# Altium footprint library ST封装.PcbLib: 1336 footprints (part 102 of 109)
Each footprint in its own frame and in the unit in brackets; x right, y up, seen from the top. Pads: shape width x height; smd on the part's side, far side on the other; paste and mask are expansions set on the pad; w line width, h text height; cw(c..) or ccw(c..) is an arc to the next point about the centre after c.
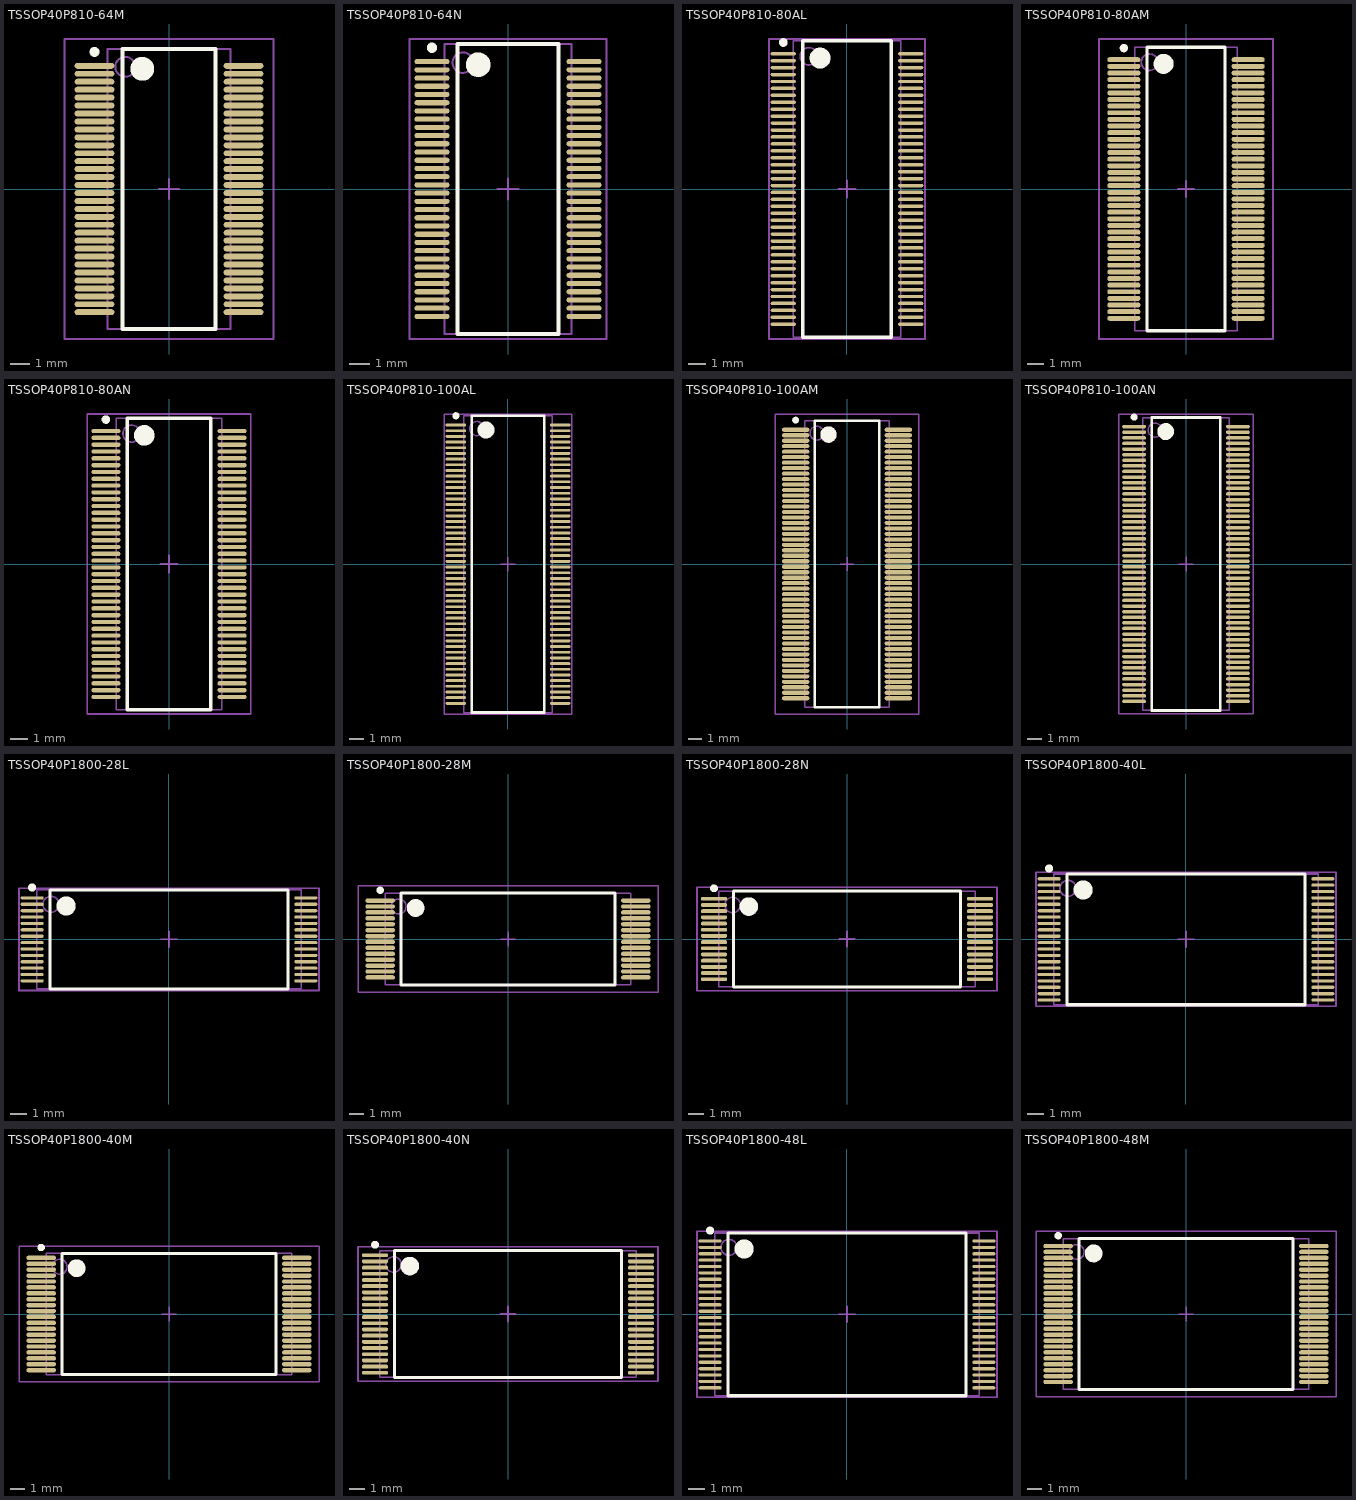
[diagram p101: the footprints below, top view; thin cyan lines are the x and y axes]

## TSSOP40P810-64M [mm] "TSSOP, 64-Leads, Body 14x6.1mm, Pitch 0.4mm, IPC Low Density"
height 1.2
pads (64):
  oval 2x0.3 smd: 1(-3.75,6.2) 2(-3.75,5.8) 3(-3.75,5.4) 4(-3.75,5) 5(-3.75,4.6) 6(-3.75,4.2) 7(-3.75,3.8) 8(-3.75,3.4) 9(-3.75,3) 10(-3.75,2.6) 11(-3.75,2.2) 12(-3.75,1.8) 13(-3.75,1.4) 14(-3.75,1) 15(-3.75,0.6) 16(-3.75,0.2) 17(-3.75,-0.2) 18(-3.75,-0.6) 19(-3.75,-1) 20(-3.75,-1.4) 21(-3.75,-1.8) 22(-3.75,-2.2) 23(-3.75,-2.6) 24(-3.75,-3) 25(-3.75,-3.4) 26(-3.75,-3.8) 27(-3.75,-4.2) 28(-3.75,-4.6) 29(-3.75,-5) 30(-3.75,-5.4) 31(-3.75,-5.8) 32(-3.75,-6.2) 33(3.75,-6.2) 34(3.75,-5.8) 35(3.75,-5.4) 36(3.75,-5) 37(3.75,-4.6) 38(3.75,-4.2) 39(3.75,-3.8) 40(3.75,-3.4) 41(3.75,-3) 42(3.75,-2.6) 43(3.75,-2.2) 44(3.75,-1.8) 45(3.75,-1.4) 46(3.75,-1) 47(3.75,-0.6) 48(3.75,-0.2) 49(3.75,0.2) 50(3.75,0.6) 51(3.75,1) 52(3.75,1.4) 53(3.75,1.8) 54(3.75,2.2) 55(3.75,2.6) 56(3.75,3) 57(3.75,3.4) 58(3.75,3.8) 59(3.75,4.2) 60(3.75,4.6) 61(3.75,5) 62(3.75,5.4) 63(3.75,5.8) 64(3.75,6.2)
Top Overlay:
  circle w0.6: c-1.35,6.05 r0.3
  circle w0.25: c-3.75,6.9 r0.125
  lines w0.2: -2.35,-7.05 2.35,-7.05 2.35,7.05 -2.35,7.05 -2.35,-7.05
Mechanical 13:
  circle w0.1: c-2.2,6.15 r0.5
  lines w0.1: -3.1,-7.05 3.1,-7.05 3.1,7.05 -3.1,7.05 -3.1,-7.05
Mechanical 15:
  lines w0.1: -0.5,0 0.5,0 ; 0,-0.5 0,0.5 ; -5.25,-7.55 5.25,-7.55 5.25,7.55 -5.25,7.55 -5.25,-7.55
3D body: height 1.2, standoff 0, extent -3.1,-7.05 3.1,7.05

## TSSOP40P810-64N [mm] "TSSOP, 64-Leads, Body 14x6.1mm, Pitch 0.4mm, IPC Medium Density"
height 1.2
pads (64):
  oval 1.7x0.25 smd: 1(-3.7,6.2) 2(-3.7,5.8) 3(-3.7,5.4) 4(-3.7,5) 5(-3.7,4.6) 6(-3.7,4.2) 7(-3.7,3.8) 8(-3.7,3.4) 9(-3.7,3) 10(-3.7,2.6) 11(-3.7,2.2) 12(-3.7,1.8) 13(-3.7,1.4) 14(-3.7,1) 15(-3.7,0.6) 16(-3.7,0.2) 17(-3.7,-0.2) 18(-3.7,-0.6) 19(-3.7,-1) 20(-3.7,-1.4) 21(-3.7,-1.8) 22(-3.7,-2.2) 23(-3.7,-2.6) 24(-3.7,-3) 25(-3.7,-3.4) 26(-3.7,-3.8) 27(-3.7,-4.2) 28(-3.7,-4.6) 29(-3.7,-5) 30(-3.7,-5.4) 31(-3.7,-5.8) 32(-3.7,-6.2) 33(3.7,-6.2) 34(3.7,-5.8) 35(3.7,-5.4) 36(3.7,-5) 37(3.7,-4.6) 38(3.7,-4.2) 39(3.7,-3.8) 40(3.7,-3.4) 41(3.7,-3) 42(3.7,-2.6) 43(3.7,-2.2) 44(3.7,-1.8) 45(3.7,-1.4) 46(3.7,-1) 47(3.7,-0.6) 48(3.7,-0.2) 49(3.7,0.2) 50(3.7,0.6) 51(3.7,1) 52(3.7,1.4) 53(3.7,1.8) 54(3.7,2.2) 55(3.7,2.6) 56(3.7,3) 57(3.7,3.4) 58(3.7,3.8) 59(3.7,4.2) 60(3.7,4.6) 61(3.7,5) 62(3.7,5.4) 63(3.7,5.8) 64(3.7,6.2)
Top Overlay:
  circle w0.6: c-1.45,6.05 r0.3
  circle w0.25: c-3.7,6.875 r0.125
  lines w0.2: -2.45,-7.05 2.45,-7.05 2.45,7.05 -2.45,7.05 -2.45,-7.05
Mechanical 13:
  circle w0.1: c-2.2,6.15 r0.5
  lines w0.1: -3.1,-7.05 3.1,-7.05 3.1,7.05 -3.1,7.05 -3.1,-7.05
Mechanical 15:
  lines w0.1: -0.5,0 0.5,0 ; 0,-0.5 0,0.5 ; -4.8,-7.3 4.8,-7.3 4.8,7.3 -4.8,7.3 -4.8,-7.3
3D body: height 1.2, standoff 0, extent -3.1,-7.05 3.1,7.05

## TSSOP40P810-80AL [mm] "TSSOP, 80-Leads, Body 17x6.1mm, Pitch 0.4mm, IPC High Density"
height 1.2
pads (80):
  oval 1.45x0.2 smd: 1(-3.675,7.8) 2(-3.675,7.4) 3(-3.675,7) 4(-3.675,6.6) 5(-3.675,6.2) 6(-3.675,5.8) 7(-3.675,5.4) 8(-3.675,5) 9(-3.675,4.6) 10(-3.675,4.2) 11(-3.675,3.8) 12(-3.675,3.4) 13(-3.675,3) 14(-3.675,2.6) 15(-3.675,2.2) 16(-3.675,1.8) 17(-3.675,1.4) 18(-3.675,1) 19(-3.675,0.6) 20(-3.675,0.2) 21(-3.675,-0.2) 22(-3.675,-0.6) 23(-3.675,-1) 24(-3.675,-1.4) 25(-3.675,-1.8) 26(-3.675,-2.2) 27(-3.675,-2.6) 28(-3.675,-3) 29(-3.675,-3.4) 30(-3.675,-3.8) 31(-3.675,-4.2) 32(-3.675,-4.6) 33(-3.675,-5) 34(-3.675,-5.4) 35(-3.675,-5.8) 36(-3.675,-6.2) 37(-3.675,-6.6) 38(-3.675,-7) 39(-3.675,-7.4) 40(-3.675,-7.8) 41(3.675,-7.8) 42(3.675,-7.4) 43(3.675,-7) 44(3.675,-6.6) 45(3.675,-6.2) 46(3.675,-5.8) 47(3.675,-5.4) 48(3.675,-5) 49(3.675,-4.6) 50(3.675,-4.2) 51(3.675,-3.8) 52(3.675,-3.4) 53(3.675,-3) 54(3.675,-2.6) 55(3.675,-2.2) 56(3.675,-1.8) 57(3.675,-1.4) 58(3.675,-1) 59(3.675,-0.6) 60(3.675,-0.2) 61(3.675,0.2) 62(3.675,0.6) 63(3.675,1) 64(3.675,1.4) 65(3.675,1.8) 66(3.675,2.2) 67(3.675,2.6) 68(3.675,3) 69(3.675,3.4) 70(3.675,3.8) 71(3.675,4.2) 72(3.675,4.6) 73(3.675,5) 74(3.675,5.4) 75(3.675,5.8) 76(3.675,6.2) 77(3.675,6.6) 78(3.675,7) 79(3.675,7.4) 80(3.675,7.8)
Top Overlay:
  circle w0.6: c-1.55,7.55 r0.3
  circle w0.25: c-3.675,8.45 r0.125
  lines w0.2: -2.55,-8.55 2.55,-8.55 2.55,8.55 -2.55,8.55 -2.55,-8.55
Mechanical 13:
  circle w0.1: c-2.2,7.65 r0.5
  lines w0.1: -3.1,-8.55 3.1,-8.55 3.1,8.55 -3.1,8.55 -3.1,-8.55
Mechanical 15:
  lines w0.1: -0.5,0 0.5,0 ; 0,-0.5 0,0.5 ; -4.5,-8.65 4.5,-8.65 4.5,8.65 -4.5,8.65 -4.5,-8.65
3D body: height 1.2, standoff 0, extent -3.1,-8.55 3.1,8.55

## TSSOP40P810-80AM [mm] "TSSOP, 80-Leads, Body 17x6.1mm, Pitch 0.4mm, IPC Low Density"
height 1.2
pads (80):
  oval 2x0.3 smd: 1(-3.75,7.8) 2(-3.75,7.4) 3(-3.75,7) 4(-3.75,6.6) 5(-3.75,6.2) 6(-3.75,5.8) 7(-3.75,5.4) 8(-3.75,5) 9(-3.75,4.6) 10(-3.75,4.2) 11(-3.75,3.8) 12(-3.75,3.4) 13(-3.75,3) 14(-3.75,2.6) 15(-3.75,2.2) 16(-3.75,1.8) 17(-3.75,1.4) 18(-3.75,1) 19(-3.75,0.6) 20(-3.75,0.2) 21(-3.75,-0.2) 22(-3.75,-0.6) 23(-3.75,-1) 24(-3.75,-1.4) 25(-3.75,-1.8) 26(-3.75,-2.2) 27(-3.75,-2.6) 28(-3.75,-3) 29(-3.75,-3.4) 30(-3.75,-3.8) 31(-3.75,-4.2) 32(-3.75,-4.6) 33(-3.75,-5) 34(-3.75,-5.4) 35(-3.75,-5.8) 36(-3.75,-6.2) 37(-3.75,-6.6) 38(-3.75,-7) 39(-3.75,-7.4) 40(-3.75,-7.8) 41(3.75,-7.8) 42(3.75,-7.4) 43(3.75,-7) 44(3.75,-6.6) 45(3.75,-6.2) 46(3.75,-5.8) 47(3.75,-5.4) 48(3.75,-5) 49(3.75,-4.6) 50(3.75,-4.2) 51(3.75,-3.8) 52(3.75,-3.4) 53(3.75,-3) 54(3.75,-2.6) 55(3.75,-2.2) 56(3.75,-1.8) 57(3.75,-1.4) 58(3.75,-1) 59(3.75,-0.6) 60(3.75,-0.2) 61(3.75,0.2) 62(3.75,0.6) 63(3.75,1) 64(3.75,1.4) 65(3.75,1.8) 66(3.75,2.2) 67(3.75,2.6) 68(3.75,3) 69(3.75,3.4) 70(3.75,3.8) 71(3.75,4.2) 72(3.75,4.6) 73(3.75,5) 74(3.75,5.4) 75(3.75,5.8) 76(3.75,6.2) 77(3.75,6.6) 78(3.75,7) 79(3.75,7.4) 80(3.75,7.8)
Top Overlay:
  circle w0.6: c-1.35,7.55 r0.3
  circle w0.25: c-3.75,8.5 r0.125
  lines w0.2: -2.35,-8.55 2.35,-8.55 2.35,8.55 -2.35,8.55 -2.35,-8.55
Mechanical 13:
  circle w0.1: c-2.2,7.65 r0.5
  lines w0.1: -3.1,-8.55 3.1,-8.55 3.1,8.55 -3.1,8.55 -3.1,-8.55
Mechanical 15:
  lines w0.1: -0.5,0 0.5,0 ; 0,-0.5 0,0.5 ; -5.25,-9.05 5.25,-9.05 5.25,9.05 -5.25,9.05 -5.25,-9.05
3D body: height 1.2, standoff 0, extent -3.1,-8.55 3.1,8.55

## TSSOP40P810-80AN [mm] "TSSOP, 80-Leads, Body 17x6.1mm, Pitch 0.4mm, IPC Medium Density"
height 1.2
pads (80):
  oval 1.7x0.25 smd: 1(-3.7,7.8) 2(-3.7,7.4) 3(-3.7,7) 4(-3.7,6.6) 5(-3.7,6.2) 6(-3.7,5.8) 7(-3.7,5.4) 8(-3.7,5) 9(-3.7,4.6) 10(-3.7,4.2) 11(-3.7,3.8) 12(-3.7,3.4) 13(-3.7,3) 14(-3.7,2.6) 15(-3.7,2.2) 16(-3.7,1.8) 17(-3.7,1.4) 18(-3.7,1) 19(-3.7,0.6) 20(-3.7,0.2) 21(-3.7,-0.2) 22(-3.7,-0.6) 23(-3.7,-1) 24(-3.7,-1.4) 25(-3.7,-1.8) 26(-3.7,-2.2) 27(-3.7,-2.6) 28(-3.7,-3) 29(-3.7,-3.4) 30(-3.7,-3.8) 31(-3.7,-4.2) 32(-3.7,-4.6) 33(-3.7,-5) 34(-3.7,-5.4) 35(-3.7,-5.8) 36(-3.7,-6.2) 37(-3.7,-6.6) 38(-3.7,-7) 39(-3.7,-7.4) 40(-3.7,-7.8) 41(3.7,-7.8) 42(3.7,-7.4) 43(3.7,-7) 44(3.7,-6.6) 45(3.7,-6.2) 46(3.7,-5.8) 47(3.7,-5.4) 48(3.7,-5) 49(3.7,-4.6) 50(3.7,-4.2) 51(3.7,-3.8) 52(3.7,-3.4) 53(3.7,-3) 54(3.7,-2.6) 55(3.7,-2.2) 56(3.7,-1.8) 57(3.7,-1.4) 58(3.7,-1) 59(3.7,-0.6) 60(3.7,-0.2) 61(3.7,0.2) 62(3.7,0.6) 63(3.7,1) 64(3.7,1.4) 65(3.7,1.8) 66(3.7,2.2) 67(3.7,2.6) 68(3.7,3) 69(3.7,3.4) 70(3.7,3.8) 71(3.7,4.2) 72(3.7,4.6) 73(3.7,5) 74(3.7,5.4) 75(3.7,5.8) 76(3.7,6.2) 77(3.7,6.6) 78(3.7,7) 79(3.7,7.4) 80(3.7,7.8)
Top Overlay:
  circle w0.6: c-1.45,7.55 r0.3
  circle w0.25: c-3.7,8.475 r0.125
  lines w0.2: -2.45,-8.55 2.45,-8.55 2.45,8.55 -2.45,8.55 -2.45,-8.55
Mechanical 13:
  circle w0.1: c-2.2,7.65 r0.5
  lines w0.1: -3.1,-8.55 3.1,-8.55 3.1,8.55 -3.1,8.55 -3.1,-8.55
Mechanical 15:
  lines w0.1: -0.5,0 0.5,0 ; 0,-0.5 0,0.5 ; -4.8,-8.8 4.8,-8.8 4.8,8.8 -4.8,8.8 -4.8,-8.8
3D body: height 1.2, standoff 0, extent -3.1,-8.55 3.1,8.55

## TSSOP40P810-100AL [mm] "TSSOP, 100-Leads, Body 20.8x6.1mm, Pitch 0.4mm, IPC High Density"
height 1.2
pads (100):
  oval 1.45x0.2 smd: 1(-3.675,9.8) 2(-3.675,9.4) 3(-3.675,9) 4(-3.675,8.6) 5(-3.675,8.2) 6(-3.675,7.8) 7(-3.675,7.4) 8(-3.675,7) 9(-3.675,6.6) 10(-3.675,6.2) 11(-3.675,5.8) 12(-3.675,5.4) 13(-3.675,5) 14(-3.675,4.6) 15(-3.675,4.2) 16(-3.675,3.8) 17(-3.675,3.4) 18(-3.675,3) 19(-3.675,2.6) 20(-3.675,2.2) 21(-3.675,1.8) 22(-3.675,1.4) 23(-3.675,1) 24(-3.675,0.6) 25(-3.675,0.2) 26(-3.675,-0.2) 27(-3.675,-0.6) 28(-3.675,-1) 29(-3.675,-1.4) 30(-3.675,-1.8) 31(-3.675,-2.2) 32(-3.675,-2.6) 33(-3.675,-3) 34(-3.675,-3.4) 35(-3.675,-3.8) 36(-3.675,-4.2) 37(-3.675,-4.6) 38(-3.675,-5) 39(-3.675,-5.4) 40(-3.675,-5.8) 41(-3.675,-6.2) 42(-3.675,-6.6) 43(-3.675,-7) 44(-3.675,-7.4) 45(-3.675,-7.8) 46(-3.675,-8.2) 47(-3.675,-8.6) 48(-3.675,-9) 49(-3.675,-9.4) 50(-3.675,-9.8) 51(3.675,-9.8) 52(3.675,-9.4) 53(3.675,-9) 54(3.675,-8.6) 55(3.675,-8.2) 56(3.675,-7.8) 57(3.675,-7.4) 58(3.675,-7) 59(3.675,-6.6) 60(3.675,-6.2) 61(3.675,-5.8) 62(3.675,-5.4) 63(3.675,-5) 64(3.675,-4.6) 65(3.675,-4.2) 66(3.675,-3.8) 67(3.675,-3.4) 68(3.675,-3) 69(3.675,-2.6) 70(3.675,-2.2) 71(3.675,-1.8) 72(3.675,-1.4) 73(3.675,-1) 74(3.675,-0.6) 75(3.675,-0.2) 76(3.675,0.2) 77(3.675,0.6) 78(3.675,1) 79(3.675,1.4) 80(3.675,1.8) 81(3.675,2.2) 82(3.675,2.6) 83(3.675,3) 84(3.675,3.4) 85(3.675,3.8) 86(3.675,4.2) 87(3.675,4.6) 88(3.675,5) 89(3.675,5.4) 90(3.675,5.8) 91(3.675,6.2) 92(3.675,6.6) 93(3.675,7) 94(3.675,7.4) 95(3.675,7.8) 96(3.675,8.2) 97(3.675,8.6) 98(3.675,9) 99(3.675,9.4) 100(3.675,9.8)
Top Overlay:
  circle w0.6: c-1.55,9.45 r0.3
  circle w0.25: c-3.675,10.45 r0.125
  lines w0.2: -2.55,-10.45 2.55,-10.45 2.55,10.45 -2.55,10.45 -2.55,-10.45
Mechanical 13:
  circle w0.1: c-2.2,9.55 r0.5
  lines w0.1: -3.1,-10.45 3.1,-10.45 3.1,10.45 -3.1,10.45 -3.1,-10.45
Mechanical 15:
  lines w0.1: -0.5,0 0.5,0 ; 0,-0.5 0,0.5 ; -4.5,-10.55 4.5,-10.55 4.5,10.55 -4.5,10.55 -4.5,-10.55
3D body: height 1.2, standoff 0, extent -3.1,-10.45 3.1,10.45

## TSSOP40P810-100AM [mm] "TSSOP, 100-Leads, Body 20.8x6.1mm, Pitch 0.4mm, IPC Low Density"
height 1.2
pads (100):
  oval 2x0.3 smd: 1(-3.75,9.8) 2(-3.75,9.4) 3(-3.75,9) 4(-3.75,8.6) 5(-3.75,8.2) 6(-3.75,7.8) 7(-3.75,7.4) 8(-3.75,7) 9(-3.75,6.6) 10(-3.75,6.2) 11(-3.75,5.8) 12(-3.75,5.4) 13(-3.75,5) 14(-3.75,4.6) 15(-3.75,4.2) 16(-3.75,3.8) 17(-3.75,3.4) 18(-3.75,3) 19(-3.75,2.6) 20(-3.75,2.2) 21(-3.75,1.8) 22(-3.75,1.4) 23(-3.75,1) 24(-3.75,0.6) 25(-3.75,0.2) 26(-3.75,-0.2) 27(-3.75,-0.6) 28(-3.75,-1) 29(-3.75,-1.4) 30(-3.75,-1.8) 31(-3.75,-2.2) 32(-3.75,-2.6) 33(-3.75,-3) 34(-3.75,-3.4) 35(-3.75,-3.8) 36(-3.75,-4.2) 37(-3.75,-4.6) 38(-3.75,-5) 39(-3.75,-5.4) 40(-3.75,-5.8) 41(-3.75,-6.2) 42(-3.75,-6.6) 43(-3.75,-7) 44(-3.75,-7.4) 45(-3.75,-7.8) 46(-3.75,-8.2) 47(-3.75,-8.6) 48(-3.75,-9) 49(-3.75,-9.4) 50(-3.75,-9.8) 51(3.75,-9.8) 52(3.75,-9.4) 53(3.75,-9) 54(3.75,-8.6) 55(3.75,-8.2) 56(3.75,-7.8) 57(3.75,-7.4) 58(3.75,-7) 59(3.75,-6.6) 60(3.75,-6.2) 61(3.75,-5.8) 62(3.75,-5.4) 63(3.75,-5) 64(3.75,-4.6) 65(3.75,-4.2) 66(3.75,-3.8) 67(3.75,-3.4) 68(3.75,-3) 69(3.75,-2.6) 70(3.75,-2.2) 71(3.75,-1.8) 72(3.75,-1.4) 73(3.75,-1) 74(3.75,-0.6) 75(3.75,-0.2) 76(3.75,0.2) 77(3.75,0.6) 78(3.75,1) 79(3.75,1.4) 80(3.75,1.8) 81(3.75,2.2) 82(3.75,2.6) 83(3.75,3) 84(3.75,3.4) 85(3.75,3.8) 86(3.75,4.2) 87(3.75,4.6) 88(3.75,5) 89(3.75,5.4) 90(3.75,5.8) 91(3.75,6.2) 92(3.75,6.6) 93(3.75,7) 94(3.75,7.4) 95(3.75,7.8) 96(3.75,8.2) 97(3.75,8.6) 98(3.75,9) 99(3.75,9.4) 100(3.75,9.8)
Top Overlay:
  circle w0.6: c-1.35,9.45 r0.3
  circle w0.25: c-3.75,10.5 r0.125
  lines w0.2: -2.35,-10.45 2.35,-10.45 2.35,10.45 -2.35,10.45 -2.35,-10.45
Mechanical 13:
  circle w0.1: c-2.2,9.55 r0.5
  lines w0.1: -3.1,-10.45 3.1,-10.45 3.1,10.45 -3.1,10.45 -3.1,-10.45
Mechanical 15:
  lines w0.1: -0.5,0 0.5,0 ; 0,-0.5 0,0.5 ; -5.25,-10.95 5.25,-10.95 5.25,10.95 -5.25,10.95 -5.25,-10.95
3D body: height 1.2, standoff 0, extent -3.1,-10.45 3.1,10.45

## TSSOP40P810-100AN [mm] "TSSOP, 100-Leads, Body 20.8x6.1mm, Pitch 0.4mm, IPC Medium Density"
height 1.2
pads (100):
  oval 1.7x0.25 smd: 1(-3.7,9.8) 2(-3.7,9.4) 3(-3.7,9) 4(-3.7,8.6) 5(-3.7,8.2) 6(-3.7,7.8) 7(-3.7,7.4) 8(-3.7,7) 9(-3.7,6.6) 10(-3.7,6.2) 11(-3.7,5.8) 12(-3.7,5.4) 13(-3.7,5) 14(-3.7,4.6) 15(-3.7,4.2) 16(-3.7,3.8) 17(-3.7,3.4) 18(-3.7,3) 19(-3.7,2.6) 20(-3.7,2.2) 21(-3.7,1.8) 22(-3.7,1.4) 23(-3.7,1) 24(-3.7,0.6) 25(-3.7,0.2) 26(-3.7,-0.2) 27(-3.7,-0.6) 28(-3.7,-1) 29(-3.7,-1.4) 30(-3.7,-1.8) 31(-3.7,-2.2) 32(-3.7,-2.6) 33(-3.7,-3) 34(-3.7,-3.4) 35(-3.7,-3.8) 36(-3.7,-4.2) 37(-3.7,-4.6) 38(-3.7,-5) 39(-3.7,-5.4) 40(-3.7,-5.8) 41(-3.7,-6.2) 42(-3.7,-6.6) 43(-3.7,-7) 44(-3.7,-7.4) 45(-3.7,-7.8) 46(-3.7,-8.2) 47(-3.7,-8.6) 48(-3.7,-9) 49(-3.7,-9.4) 50(-3.7,-9.8) 51(3.7,-9.8) 52(3.7,-9.4) 53(3.7,-9) 54(3.7,-8.6) 55(3.7,-8.2) 56(3.7,-7.8) 57(3.7,-7.4) 58(3.7,-7) 59(3.7,-6.6) 60(3.7,-6.2) 61(3.7,-5.8) 62(3.7,-5.4) 63(3.7,-5) 64(3.7,-4.6) 65(3.7,-4.2) 66(3.7,-3.8) 67(3.7,-3.4) 68(3.7,-3) 69(3.7,-2.6) 70(3.7,-2.2) 71(3.7,-1.8) 72(3.7,-1.4) 73(3.7,-1) 74(3.7,-0.6) 75(3.7,-0.2) 76(3.7,0.2) 77(3.7,0.6) 78(3.7,1) 79(3.7,1.4) 80(3.7,1.8) 81(3.7,2.2) 82(3.7,2.6) 83(3.7,3) 84(3.7,3.4) 85(3.7,3.8) 86(3.7,4.2) 87(3.7,4.6) 88(3.7,5) 89(3.7,5.4) 90(3.7,5.8) 91(3.7,6.2) 92(3.7,6.6) 93(3.7,7) 94(3.7,7.4) 95(3.7,7.8) 96(3.7,8.2) 97(3.7,8.6) 98(3.7,9) 99(3.7,9.4) 100(3.7,9.8)
Top Overlay:
  circle w0.6: c-1.45,9.45 r0.3
  circle w0.25: c-3.7,10.475 r0.125
  lines w0.2: -2.45,-10.45 2.45,-10.45 2.45,10.45 -2.45,10.45 -2.45,-10.45
Mechanical 13:
  circle w0.1: c-2.2,9.55 r0.5
  lines w0.1: -3.1,-10.45 3.1,-10.45 3.1,10.45 -3.1,10.45 -3.1,-10.45
Mechanical 15:
  lines w0.1: -0.5,0 0.5,0 ; 0,-0.5 0,0.5 ; -4.8,-10.7 4.8,-10.7 4.8,10.7 -4.8,10.7 -4.8,-10.7
3D body: height 1.2, standoff 0, extent -3.1,-10.45 3.1,10.45

## TSSOP40P1800-28L [mm] "TSSOP, 28-Leads, Body 6x16.4mm, Pitch 0.4mm, IPC High Density"
height 1.27
pads (28):
  oval 1.45x0.2 smd: 1(-8.575,2.6) 2(-8.575,2.2) 3(-8.575,1.8) 4(-8.575,1.4) 5(-8.575,1) 6(-8.575,0.6) 7(-8.575,0.2) 8(-8.575,-0.2) 9(-8.575,-0.6) 10(-8.575,-1) 11(-8.575,-1.4) 12(-8.575,-1.8) 13(-8.575,-2.2) 14(-8.575,-2.6) 15(8.575,-2.6) 16(8.575,-2.2) 17(8.575,-1.8) 18(8.575,-1.4) 19(8.575,-1) 20(8.575,-0.6) 21(8.575,-0.2) 22(8.575,0.2) 23(8.575,0.6) 24(8.575,1) 25(8.575,1.4) 26(8.575,1.8) 27(8.575,2.2) 28(8.575,2.6)
Top Overlay:
  circle w0.6: c-6.45,2.1 r0.3
  circle w0.25: c-8.575,3.25 r0.125
  lines w0.2: -7.45,-3.1 7.45,-3.1 7.45,3.1 -7.45,3.1 -7.45,-3.1
Mechanical 13:
  circle w0.1: c-7.4,2.2 r0.5
  lines w0.1: -8.3,-3.1 8.3,-3.1 8.3,3.1 -8.3,3.1 -8.3,-3.1
Mechanical 15:
  lines w0.1: -0.5,0 0.5,0 ; 0,-0.5 0,0.5 ; -9.4,-3.2 9.4,-3.2 9.4,3.2 -9.4,3.2 -9.4,-3.2
3D body: height 1.27, standoff 0, extent -8.3,-3.1 8.3,3.1

## TSSOP40P1800-28M [mm] "TSSOP, 28-Leads, Body 6x16.4mm, Pitch 0.4mm, IPC Low Density"
height 1.27
pads (28):
  oval 2x0.3 smd: 1(-8.65,2.6) 2(-8.65,2.2) 3(-8.65,1.8) 4(-8.65,1.4) 5(-8.65,1) 6(-8.65,0.6) 7(-8.65,0.2) 8(-8.65,-0.2) 9(-8.65,-0.6) 10(-8.65,-1) 11(-8.65,-1.4) 12(-8.65,-1.8) 13(-8.65,-2.2) 14(-8.65,-2.6) 15(8.65,-2.6) 16(8.65,-2.2) 17(8.65,-1.8) 18(8.65,-1.4) 19(8.65,-1) 20(8.65,-0.6) 21(8.65,-0.2) 22(8.65,0.2) 23(8.65,0.6) 24(8.65,1) 25(8.65,1.4) 26(8.65,1.8) 27(8.65,2.2) 28(8.65,2.6)
Top Overlay:
  circle w0.6: c-6.25,2.1 r0.3
  circle w0.25: c-8.65,3.3 r0.125
  lines w0.2: -7.25,-3.1 7.25,-3.1 7.25,3.1 -7.25,3.1 -7.25,-3.1
Mechanical 13:
  circle w0.1: c-7.4,2.2 r0.5
  lines w0.1: -8.3,-3.1 8.3,-3.1 8.3,3.1 -8.3,3.1 -8.3,-3.1
Mechanical 15:
  lines w0.1: -0.5,0 0.5,0 ; 0,-0.5 0,0.5 ; -10.15,-3.6 10.15,-3.6 10.15,3.6 -10.15,3.6 -10.15,-3.6
3D body: height 1.27, standoff 0, extent -8.3,-3.1 8.3,3.1

## TSSOP40P1800-28N [mm] "TSSOP, 28-Leads, Body 6x16.4mm, Pitch 0.4mm, IPC Medium Density"
height 1.27
pads (28):
  oval 1.7x0.25 smd: 1(-8.6,2.6) 2(-8.6,2.2) 3(-8.6,1.8) 4(-8.6,1.4) 5(-8.6,1) 6(-8.6,0.6) 7(-8.6,0.2) 8(-8.6,-0.2) 9(-8.6,-0.6) 10(-8.6,-1) 11(-8.6,-1.4) 12(-8.6,-1.8) 13(-8.6,-2.2) 14(-8.6,-2.6) 15(8.6,-2.6) 16(8.6,-2.2) 17(8.6,-1.8) 18(8.6,-1.4) 19(8.6,-1) 20(8.6,-0.6) 21(8.6,-0.2) 22(8.6,0.2) 23(8.6,0.6) 24(8.6,1) 25(8.6,1.4) 26(8.6,1.8) 27(8.6,2.2) 28(8.6,2.6)
Top Overlay:
  circle w0.6: c-6.35,2.1 r0.3
  circle w0.25: c-8.6,3.275 r0.125
  lines w0.2: -7.35,-3.1 7.35,-3.1 7.35,3.1 -7.35,3.1 -7.35,-3.1
Mechanical 13:
  circle w0.1: c-7.4,2.2 r0.5
  lines w0.1: -8.3,-3.1 8.3,-3.1 8.3,3.1 -8.3,3.1 -8.3,-3.1
Mechanical 15:
  lines w0.1: -0.5,0 0.5,0 ; 0,-0.5 0,0.5 ; -9.7,-3.35 9.7,-3.35 9.7,3.35 -9.7,3.35 -9.7,-3.35
3D body: height 1.27, standoff 0, extent -8.3,-3.1 8.3,3.1

## TSSOP40P1800-40L [mm] "TSSOP, 40-Leads, Body 8x16.4mm, Pitch 0.4mm, IPC High Density"
height 1.27
pads (40):
  oval 1.45x0.2 smd: 1(-8.575,3.8) 2(-8.575,3.4) 3(-8.575,3) 4(-8.575,2.6) 5(-8.575,2.2) 6(-8.575,1.8) 7(-8.575,1.4) 8(-8.575,1) 9(-8.575,0.6) 10(-8.575,0.2) 11(-8.575,-0.2) 12(-8.575,-0.6) 13(-8.575,-1) 14(-8.575,-1.4) 15(-8.575,-1.8) 16(-8.575,-2.2) 17(-8.575,-2.6) 18(-8.575,-3) 19(-8.575,-3.4) 20(-8.575,-3.8) 21(8.575,-3.8) 22(8.575,-3.4) 23(8.575,-3) 24(8.575,-2.6) 25(8.575,-2.2) 26(8.575,-1.8) 27(8.575,-1.4) 28(8.575,-1) 29(8.575,-0.6) 30(8.575,-0.2) 31(8.575,0.2) 32(8.575,0.6) 33(8.575,1) 34(8.575,1.4) 35(8.575,1.8) 36(8.575,2.2) 37(8.575,2.6) 38(8.575,3) 39(8.575,3.4) 40(8.575,3.8)
Top Overlay:
  circle w0.6: c-6.45,3.1 r0.3
  circle w0.25: c-8.575,4.45 r0.125
  lines w0.2: -7.45,-4.1 7.45,-4.1 7.45,4.1 -7.45,4.1 -7.45,-4.1
Mechanical 13:
  circle w0.1: c-7.4,3.2 r0.5
  lines w0.1: -8.3,-4.1 8.3,-4.1 8.3,4.1 -8.3,4.1 -8.3,-4.1
Mechanical 15:
  lines w0.1: -0.5,0 0.5,0 ; 0,-0.5 0,0.5 ; -9.4,-4.2 9.4,-4.2 9.4,4.2 -9.4,4.2 -9.4,-4.2
3D body: height 1.27, standoff 0, extent -8.3,-4.1 8.3,4.1

## TSSOP40P1800-40M [mm] "TSSOP, 40-Leads, Body 8x16.4mm, Pitch 0.4mm, IPC Low Density"
height 1.27
pads (40):
  oval 2x0.3 smd: 1(-8.65,3.8) 2(-8.65,3.4) 3(-8.65,3) 4(-8.65,2.6) 5(-8.65,2.2) 6(-8.65,1.8) 7(-8.65,1.4) 8(-8.65,1) 9(-8.65,0.6) 10(-8.65,0.2) 11(-8.65,-0.2) 12(-8.65,-0.6) 13(-8.65,-1) 14(-8.65,-1.4) 15(-8.65,-1.8) 16(-8.65,-2.2) 17(-8.65,-2.6) 18(-8.65,-3) 19(-8.65,-3.4) 20(-8.65,-3.8) 21(8.65,-3.8) 22(8.65,-3.4) 23(8.65,-3) 24(8.65,-2.6) 25(8.65,-2.2) 26(8.65,-1.8) 27(8.65,-1.4) 28(8.65,-1) 29(8.65,-0.6) 30(8.65,-0.2) 31(8.65,0.2) 32(8.65,0.6) 33(8.65,1) 34(8.65,1.4) 35(8.65,1.8) 36(8.65,2.2) 37(8.65,2.6) 38(8.65,3) 39(8.65,3.4) 40(8.65,3.8)
Top Overlay:
  circle w0.25: c-8.65,4.5 r0.125
  circle w0.6: c-6.25,3.1 r0.3
  lines w0.2: -7.25,-4.1 -7.25,4.1 7.25,4.1 7.25,-4.1 -7.25,-4.1
Mechanical 13:
  circle w0.1: c-7.4,3.2 r0.5
  lines w0.1: -8.3,-4.1 -8.3,4.1 8.3,4.1 8.3,-4.1 -8.3,-4.1
Mechanical 15:
  lines w0.1: -0.5,0 0.5,0 ; 0,-0.5 0,0.5 ; -10.15,-4.6 -10.15,4.6 10.15,4.6 10.15,-4.6 -10.15,-4.6
3D body: height 1.27, standoff 0, extent -8.3,-4.1 8.3,4.1

## TSSOP40P1800-40N [mm] "TSSOP, 40-Leads, Body 8x16.4mm, Pitch 0.4mm, IPC Medium Density"
height 1.27
pads (40):
  oval 1.7x0.25 smd: 1(-8.6,3.8) 2(-8.6,3.4) 3(-8.6,3) 4(-8.6,2.6) 5(-8.6,2.2) 6(-8.6,1.8) 7(-8.6,1.4) 8(-8.6,1) 9(-8.6,0.6) 10(-8.6,0.2) 11(-8.6,-0.2) 12(-8.6,-0.6) 13(-8.6,-1) 14(-8.6,-1.4) 15(-8.6,-1.8) 16(-8.6,-2.2) 17(-8.6,-2.6) 18(-8.6,-3) 19(-8.6,-3.4) 20(-8.6,-3.8) 21(8.6,-3.8) 22(8.6,-3.4) 23(8.6,-3) 24(8.6,-2.6) 25(8.6,-2.2) 26(8.6,-1.8) 27(8.6,-1.4) 28(8.6,-1) 29(8.6,-0.6) 30(8.6,-0.2) 31(8.6,0.2) 32(8.6,0.6) 33(8.6,1) 34(8.6,1.4) 35(8.6,1.8) 36(8.6,2.2) 37(8.6,2.6) 38(8.6,3) 39(8.6,3.4) 40(8.6,3.8)
Top Overlay:
  circle w0.6: c-6.35,3.1 r0.3
  circle w0.25: c-8.6,4.475 r0.125
  lines w0.2: -7.35,-4.1 7.35,-4.1 7.35,4.1 -7.35,4.1 -7.35,-4.1
Mechanical 13:
  circle w0.1: c-7.4,3.2 r0.5
  lines w0.1: -8.3,-4.1 8.3,-4.1 8.3,4.1 -8.3,4.1 -8.3,-4.1
Mechanical 15:
  lines w0.1: -0.5,0 0.5,0 ; 0,-0.5 0,0.5 ; -9.7,-4.35 9.7,-4.35 9.7,4.35 -9.7,4.35 -9.7,-4.35
3D body: height 1.27, standoff 0, extent -8.3,-4.1 8.3,4.1

## TSSOP40P1800-48L [mm] "TSSOP, 48-Leads, Body 10x16.4mm, Pitch 0.4mm, IPC High Density"
height 1.27
pads (48):
  oval 1.45x0.2 smd: 1(-8.575,4.6) 2(-8.575,4.2) 3(-8.575,3.8) 4(-8.575,3.4) 5(-8.575,3) 6(-8.575,2.6) 7(-8.575,2.2) 8(-8.575,1.8) 9(-8.575,1.4) 10(-8.575,1) 11(-8.575,0.6) 12(-8.575,0.2) 13(-8.575,-0.2) 14(-8.575,-0.6) 15(-8.575,-1) 16(-8.575,-1.4) 17(-8.575,-1.8) 18(-8.575,-2.2) 19(-8.575,-2.6) 20(-8.575,-3) 21(-8.575,-3.4) 22(-8.575,-3.8) 23(-8.575,-4.2) 24(-8.575,-4.6) 25(8.575,-4.6) 26(8.575,-4.2) 27(8.575,-3.8) 28(8.575,-3.4) 29(8.575,-3) 30(8.575,-2.6) 31(8.575,-2.2) 32(8.575,-1.8) 33(8.575,-1.4) 34(8.575,-1) 35(8.575,-0.6) 36(8.575,-0.2) 37(8.575,0.2) 38(8.575,0.6) 39(8.575,1) 40(8.575,1.4) 41(8.575,1.8) 42(8.575,2.2) 43(8.575,2.6) 44(8.575,3) 45(8.575,3.4) 46(8.575,3.8) 47(8.575,4.2) 48(8.575,4.6)
Top Overlay:
  circle w0.6: c-6.45,4.1 r0.3
  circle w0.25: c-8.575,5.25 r0.125
  lines w0.2: -7.45,-5.1 7.45,-5.1 7.45,5.1 -7.45,5.1 -7.45,-5.1
Mechanical 13:
  circle w0.1: c-7.4,4.2 r0.5
  lines w0.1: -8.3,-5.1 8.3,-5.1 8.3,5.1 -8.3,5.1 -8.3,-5.1
Mechanical 15:
  lines w0.1: -0.5,0 0.5,0 ; 0,-0.5 0,0.5 ; -9.4,-5.2 9.4,-5.2 9.4,5.2 -9.4,5.2 -9.4,-5.2
3D body: height 1.27, standoff 0, extent -8.3,-5.1 8.3,5.1

## TSSOP40P1800-48M [mm] "TSSOP, 48-Leads, Body 10x16.4mm, Pitch 0.4mm, IPC Low Density"
height 1.27
pads (48):
  oval 2x0.3 smd: 1(-8.65,4.6) 2(-8.65,4.2) 3(-8.65,3.8) 4(-8.65,3.4) 5(-8.65,3) 6(-8.65,2.6) 7(-8.65,2.2) 8(-8.65,1.8) 9(-8.65,1.4) 10(-8.65,1) 11(-8.65,0.6) 12(-8.65,0.2) 13(-8.65,-0.2) 14(-8.65,-0.6) 15(-8.65,-1) 16(-8.65,-1.4) 17(-8.65,-1.8) 18(-8.65,-2.2) 19(-8.65,-2.6) 20(-8.65,-3) 21(-8.65,-3.4) 22(-8.65,-3.8) 23(-8.65,-4.2) 24(-8.65,-4.6) 25(8.65,-4.6) 26(8.65,-4.2) 27(8.65,-3.8) 28(8.65,-3.4) 29(8.65,-3) 30(8.65,-2.6) 31(8.65,-2.2) 32(8.65,-1.8) 33(8.65,-1.4) 34(8.65,-1) 35(8.65,-0.6) 36(8.65,-0.2) 37(8.65,0.2) 38(8.65,0.6) 39(8.65,1) 40(8.65,1.4) 41(8.65,1.8) 42(8.65,2.2) 43(8.65,2.6) 44(8.65,3) 45(8.65,3.4) 46(8.65,3.8) 47(8.65,4.2) 48(8.65,4.6)
Top Overlay:
  circle w0.6: c-6.25,4.1 r0.3
  circle w0.25: c-8.65,5.3 r0.125
  lines w0.2: -7.25,-5.1 7.25,-5.1 7.25,5.1 -7.25,5.1 -7.25,-5.1
Mechanical 13:
  circle w0.1: c-7.4,4.2 r0.5
  lines w0.1: -8.3,-5.1 8.3,-5.1 8.3,5.1 -8.3,5.1 -8.3,-5.1
Mechanical 15:
  lines w0.1: -0.5,0 0.5,0 ; 0,-0.5 0,0.5 ; -10.15,-5.6 10.15,-5.6 10.15,5.6 -10.15,5.6 -10.15,-5.6
3D body: height 1.27, standoff 0, extent -8.3,-5.1 8.3,5.1